# Altium footprint library JL_PCB.PCBLIB: 1129 footprints (part 20 of 72)
Each footprint in its own frame and in the unit in brackets; x right, y up, seen from the top. Pads: shape width x height; smd on the part's side, far side on the other; paste and mask are expansions set on the pad; w line width, h text height; cw(c..) or ccw(c..) is an arc to the next point about the centre after c.
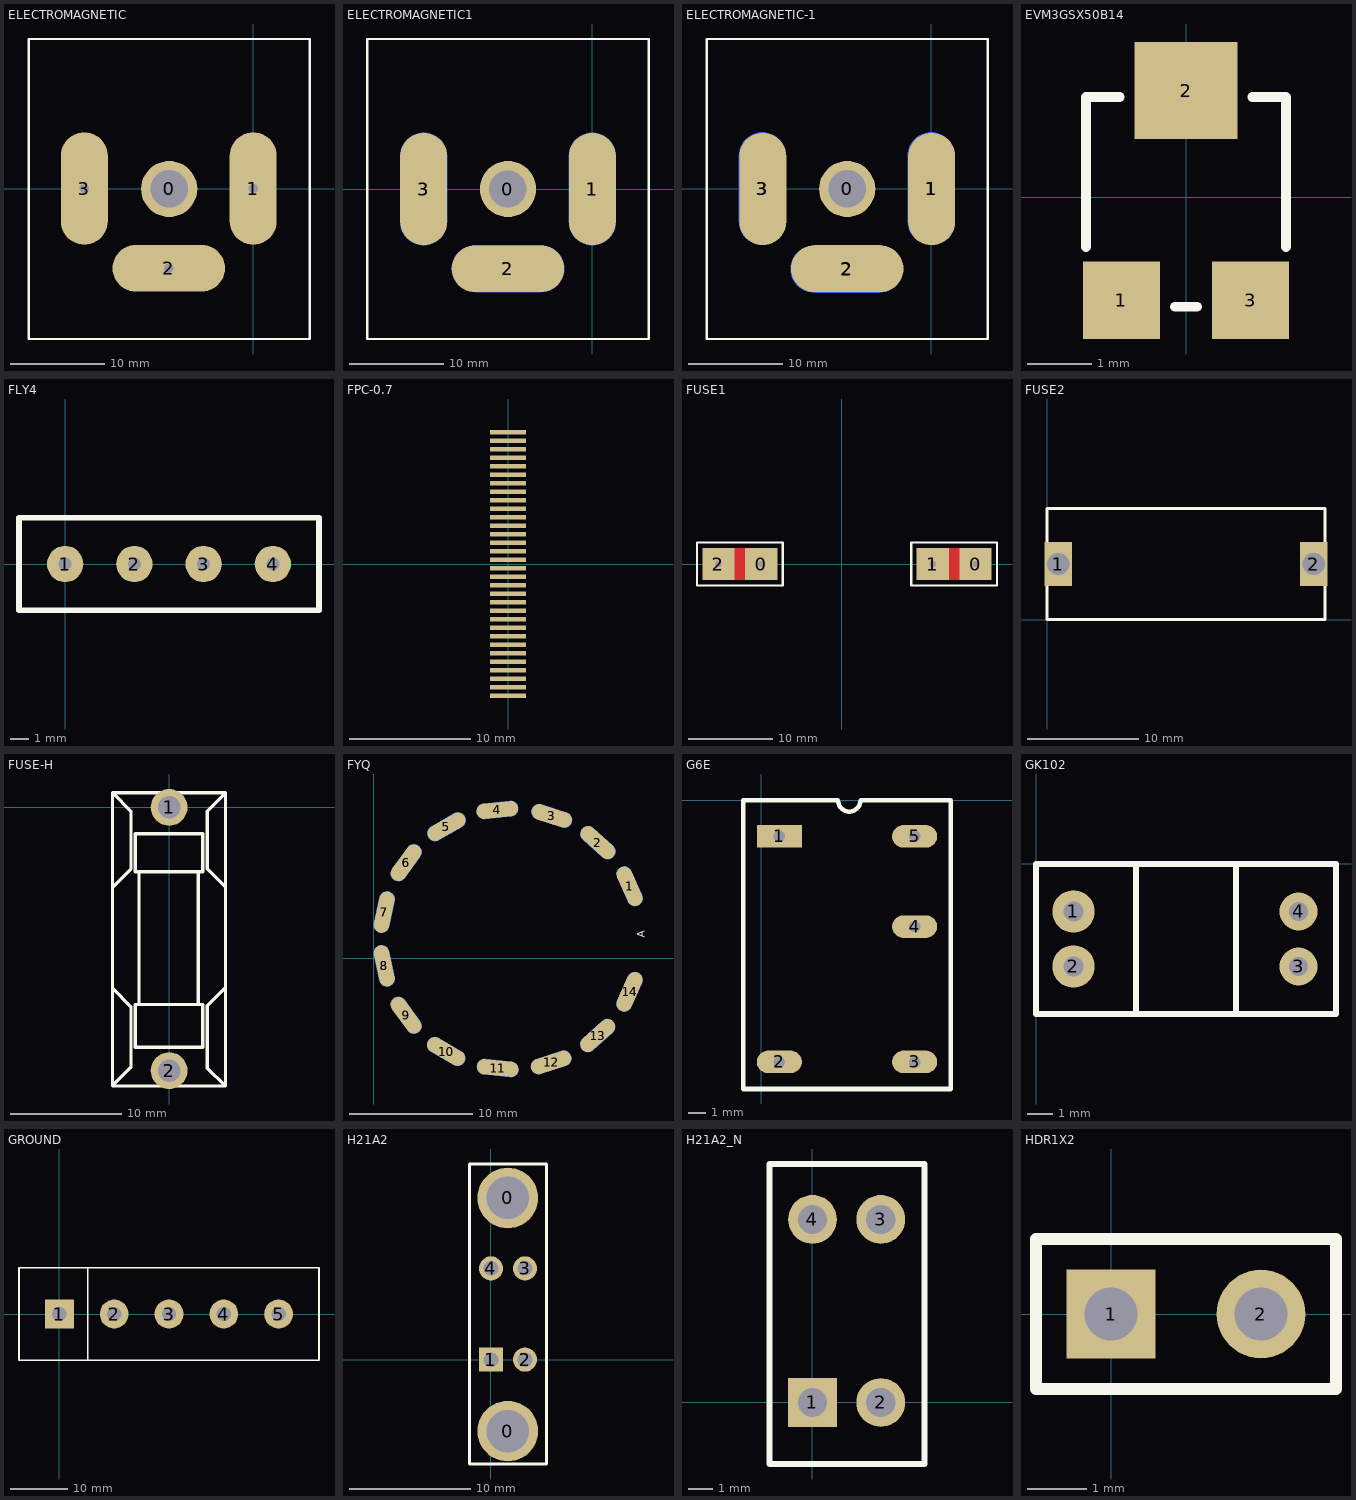
[diagram p19: the footprints below, top view; thin cyan lines are the x and y axes]

## ELECTROMAGNETIC [mm]
pads (4):
  round 6 hole 4: 0(-8.95,-0.05)
  oval 5x12 hole 1: 1(0,0) 3(-18,0)
  oval 12x5 hole 1: 2(-9,-8.5)
TopOverlay:
  lines w0.254: -23.95,-16.05 6.05,-16.05 6.05,15.95 -23.95,15.95 -23.95,-16.05
Mechanical1:
  lines w0.254: -18.45,3.9 -17.45,3.9 ; -12.7,-9.04 -12.7,-8.04 ; -0.5,3.5 0.5,3.5 ; -17.2,3.9 -16.7,3.4 ; -17.2,3.9 -16.7,3.4 ; -17.2,3.9 -16.7,3.4 ; -17.2,3.9 -18.7,3.9 -19.2,3.4 -19.2,-3.1 -19.2,-3.35 -18.7,-3.85 -17.2,-3.85 -16.7,-3.35 -16.7,3.4 ; -12.7,-7.79 -12.2,-7.29 ; -12.7,-7.79 -12.2,-7.29 ; -12.7,-7.79 -12.2,-7.29 ; -12.7,-7.79 -12.7,-9.29 -12.2,-9.79 -5.7,-9.79 -5.45,-9.79 -4.95,-9.29 -4.95,-7.79 -5.45,-7.29 -12.2,-7.29 ; 0.75,3.5 1.25,3 ; 0.75,3.5 1.25,3 ; 0.75,3.5 1.25,3 ; 0.75,3.5 -0.75,3.5 -1.25,3 -1.25,-3.5 -1.25,-3.75 -0.75,-4.25 0.75,-4.25 1.25,-3.75 1.25,3

## ELECTROMAGNETIC1 [mm]
pads (7):
  round 6 hole 4: 0(-9,0)
  oval 5x12 smd: 1(0,0) 3(-18,0)
  oval 5x12 smd far side: 1(0,0) 3(-18,0)
  oval 12x5 smd: 2(-9,-8.5)
  oval 12x5 smd far side: 2(-9,-8.5)
TopOverlay:
  lines w0.254: -24,-16 -24,16 6,16 6,-16 -24,-16
Mechanical1:
  lines w0.254: -18.5,4 -17.5,4 ; -13,-9 -13,-8 ; -0.5,4 0.5,4 ; -17.25,4 -18.75,4 -19.25,3.5 -19.25,-3 -19.25,-3.25 -18.75,-3.75 -17.25,-3.75 -16.75,-3.25 -16.75,3.5 ; -17.25,4 -16.75,3.5 ; -17.25,4 -16.75,3.5 ; -17.25,4 -16.75,3.5 ; -13,-7.75 -13,-9.25 -12.5,-9.75 -6,-9.75 -5.75,-9.75 -5.25,-9.25 -5.25,-7.75 -5.75,-7.25 -12.5,-7.25 ; -13,-7.75 -12.5,-7.25 ; -13,-7.75 -12.5,-7.25 ; -13,-7.75 -12.5,-7.25 ; 0.75,4 -0.75,4 -1.25,3.5 -1.25,-3 -1.25,-3.25 -0.75,-3.75 0.75,-3.75 1.25,-3.25 1.25,3.5 ; 0.75,4 1.25,3.5 ; 0.75,4 1.25,3.5 ; 0.75,4 1.25,3.5

## ELECTROMAGNETIC-1 [mm]
pads (7):
  round 6 hole 4: 0(-8.95,-0.05)
  oval 5x12 smd far side: 1(0,0) 3(-18,0)
  oval 5x12 smd: 1(0.05,-0.05) 3(-17.95,-0.05)
  oval 12x5 smd far side: 2(-9,-8.6)
  oval 12x5 smd: 2(-8.95,-8.55)
TopOverlay:
  lines w0.254: -23.95,-16.05 6.05,-16.05 6.05,15.95 -23.95,15.95 -23.95,-16.05
Mechanical1:
  lines w0.254: -18.45,3.9 -17.45,3.9 ; -12.7,-9.04 -12.7,-8.04 ; -0.5,3.5 0.5,3.5 ; -17.2,3.9 -16.7,3.4 ; -17.2,3.9 -16.7,3.4 ; -17.2,3.9 -16.7,3.4 ; -17.2,3.9 -18.7,3.9 -19.2,3.4 -19.2,-3.1 -19.2,-3.35 -18.7,-3.85 -17.2,-3.85 -16.7,-3.35 -16.7,3.4 ; -12.7,-7.79 -12.2,-7.29 ; -12.7,-7.79 -12.2,-7.29 ; -12.7,-7.79 -12.2,-7.29 ; -12.7,-7.79 -12.7,-9.29 -12.2,-9.79 -5.7,-9.79 -5.45,-9.79 -4.95,-9.29 -4.95,-7.79 -5.45,-7.29 -12.2,-7.29 ; 0.75,3.5 1.25,3 ; 0.75,3.5 1.25,3 ; 0.75,3.5 1.25,3 ; 0.75,3.5 -0.75,3.5 -1.25,3 -1.25,-3.5 -1.25,-3.75 -0.75,-4.25 0.75,-4.25 1.25,-3.75 1.25,3

## EVM3GSX50B14 [mm]
height 1.62
pads (3):
  rect 1.2x1.2 smd mask+0.05: 1(-1,-1.6) 3(1,-1.6)
  rect 1.6x1.5 smd mask+0.05: 2(0,1.65)
TopOverlay:
  lines w0.15: -1.55,-0.775 -1.55,1.55 -1.025,1.55 ; -0.175,-1.7 0.175,-1.7 ; 1.025,1.55 1.55,1.55 1.55,-0.775

## FLY4 [mm]
pads (4):
  round 2 hole 0.711: 1(0,0) 2(3.81,0) 3(7.62,0) 4(11.43,0)
TopOverlay:
  lines w0.305: -2.54,-2.54 13.97,-2.54 13.97,2.54 -2.54,2.54 -2.54,-2.54

## FPC-0.7 [mm]
pads (32):
  rect 3x0.4 smd: 1(0,10.85) 2(0,10.15) 3(0,9.45) 4(0,8.75) 5(0,8.05) 6(0,7.35) 7(0,6.65) 8(0,5.95) 9(0,5.25) 10(0,4.55) 11(0,3.85) 12(0,3.15) 13(0,2.45) 14(0,1.75) 15(0,1.05) 16(0,0.35) 17(0,-0.35) 18(0,-1.05) 19(0,-1.75) 20(0,-2.45) 21(0,-3.15) 22(0,-3.85) 23(0,-4.55) 24(0,-5.25) 25(0,-5.95) 26(0,-6.65) 27(0,-7.35) 28(0,-8.05) 29(0,-8.75) 30(0,-9.45) 31(0,-10.15) 32(0,-10.85)

## FUSE1 [mil]
pads (4):
  rect 150x150 hole 30: 0(-375,0) 0(625,0) 1(425,0) 2(-575,0)
TopLayer:
  rectangle: -525,-75 -425,75
  rectangle: 475,-75 575,75
BottomLayer:
  rectangle: -525,-75 -425,75
  rectangle: 475,-75 575,75
TopOverlay:
  lines w10: -675,-100 -275,-100 -275,100 -675,100 -675,-100 ; 325,-100 725,-100 725,100 325,100 325,-100
3D body "User Library-Fuse Slow-Blow.step": height 440.96, standoff 188.96, extent -621,-130 629,122
3D body "User Library-FUSECLIP.step": height 430.55, standoff -137.2, extent 414.69,-153 635.31,150.26
3D body "User Library-FUSECLIP.step": height 430.55, standoff -137.2, extent -586.32,-151.63 -365.69,151.63

## FUSE2 [mm]
pads (2):
  rect 2.5x4 hole 2: 1(1,5) 2(24,5)
TopOverlay:
  lines w0.254: 0,0 25,0 25,10 0,10 0,0
3D body "User Library-ZHL30.step": height 11.52, standoff -1.85, extent 0.348,0.228 24.748,9.628
3D body "User Library-20mm_fuse.step": height 10.5, standoff 5.5, extent 2.598,2.362 22.598,7.362

## FUSE-H [mm]
pads (2):
  round 3.3 hole 2: 1(0,-0.025) 2(0,-23.625)
TopOverlay:
  lines w0.3: -5.075,-16.25 -3.425,-17.9 -3.425,-23.325 -5,-24.9 ; -5.075,-7.2 -3.425,-5.55 -3.425,-0.375 -5.025,1.225 ; -2.7,-17.625 -2.7,-5.925 ; 2.625,-17.65 2.625,-5.85 ; 4.975,-24.95 3.425,-23.4 3.425,-17.825 5.05,-16.2 ; 5.025,1.25 3.425,-0.35 3.425,-5.525 5.05,-7.15 ; -5.075,-25 -5.075,1.3 5.05,1.3 5.05,-25 -5.075,-25 ; -3.05,-21.525 -3.05,-17.7 3.025,-17.7 3.025,-21.525 -3.05,-21.525 ; -3.05,-5.8 -3.05,-2.375 3.025,-2.375 3.025,-5.8 -3.05,-5.8

## FYQ [mil]
pads (42):
  oval 134x50 smd rot 114: 1(818.12,229.8)
  oval 134x50 smd far side rot 114: 1(818.12,229.8)
  oval 104x20 on Mech1 rot 114: 1(818.12,229.79)
  oval 134x50 smd rot 138: 2(716.69,369.4)
  oval 134x50 smd far side rot 138: 2(716.69,369.4)
  oval 104x20 on Mech1 rot 138: 2(716.69,369.41)
  oval 134x50 smd rot 162: 3(569,455)
  oval 134x50 smd far side rot 162: 3(569,455)
  oval 104x20 on Mech1 rot 162: 3(569,455)
  oval 134x50 smd rot 6: 4(395,474)
  oval 134x50 smd far side rot 6: 4(395,474)
  oval 104x20 on Mech1 rot 6: 4(395,474)
  oval 134x50 smd rot 30: 5(232,420)
  oval 134x50 smd far side rot 30: 5(232,420)
  oval 104x20 on Mech1 rot 30: 5(232,420)
  oval 134x50 smd rot 54: 6(103,305)
  oval 134x50 smd far side rot 54: 6(103,305)
  oval 104x20 on Mech1 rot 54: 6(103,305)
  oval 134x50 smd rot 78: 7(33,147)
  oval 134x50 smd far side rot 78: 7(33,147)
  oval 104x20 on Mech1 rot 78: 7(33,147)
  oval 134x50 smd rot 102: 8(33,-25)
  oval 134x50 smd far side rot 102: 8(33,-25)
  oval 104x20 on Mech1 rot 102: 8(33,-25)
  oval 134x50 smd rot 126: 9(103,-183)
  oval 134x50 smd far side rot 126: 9(103,-183)
  oval 104x20 on Mech1 rot 126: 9(103,-183)
  oval 134x50 smd rot 150: 10(231,-299)
  oval 134x50 smd far side rot 150: 10(231,-299)
  oval 104x20 on Mech1 rot 150: 10(231,-299)
  oval 134x50 smd rot 174: 11(396,-352)
  oval 134x50 smd far side rot 174: 11(396,-352)
  oval 104x20 on Mech1 rot 174: 11(396,-352)
  oval 134x50 smd rot 18: 12(567,-334)
  oval 134x50 smd far side rot 18: 12(567,-334)
  oval 104x20 on Mech1 rot 18: 12(567,-334)
  oval 134x50 smd rot 42: 13(716,-248)
  oval 134x50 smd far side rot 42: 13(716,-248)
  oval 104x20 on Mech1 rot 42: 13(716,-248)
  oval 134x50 smd rot 66: 14(818,-108)
  oval 134x50 smd far side rot 66: 14(818,-108)
  oval 104x20 on Mech1 rot 66: 14(818,-108)
TopOverlay:
  text "A" at 867,65 h25

## G6E [mil]
pads (5):
  rect 100x50 hole 25: 1(40,-80)
  oval 100x50 hole 25: 2(40,-580) 3(340,-580) 4(340,-280) 5(340,-80)
TopOverlay:
  lines w10: -40,-640 -40,0 160,0 170,0 ccw(c195,0) 220,0 420,0 420,-640 -40,-640

## GK102 [mm]
pads (4):
  round 1.7 hole 0.8: 1(1.5,-1.9) 2(1.5,-4.1)
  round 1.524 hole 0.762: 3(10.5,-4.1) 4(10.5,-1.9)
TopOverlay:
  lines w0.254: 4,-6 4,0 ; 8,-6 8,0 ; 0,-6 12,-6 12,0 0,0 0,-6

## GROUND [mm]
pads (5):
  rect 5x5 hole 2.5: 1(0,0)
  round 5 hole 2.5: 2(9.5,0) 3(19,0) 4(28.5,0) 5(38,0)
TopOverlay:
  lines w0.254: -7,-8 45,-8 ; -7,8 45,8
  lines w0.305: -7,-8 -7,8 ; 4.9,-8 4.9,8 ; 45,-8 45,8

## H21A2 [mm]
pads (6):
  round 5 hole 3.5: 0(1.385,-5.894) 0(1.385,13.306)
  rect 2x2 hole 1.2: 1(0,0)
  round 2 hole 1.2: 2(2.8,0) 3(2.8,7.5) 4(0,7.5)
TopOverlay:
  lines w0.254: -1.775,-8.6 4.575,-8.6 4.575,16.1 -1.775,16.1 -1.775,-8.6
3D body "User Library-h21a1.step": height 11.2, standoff -2, extent -1.854,-8.591 4.496,16.109

## H21A2_N [mm]
pads (4):
  rect 2x2 hole 1.2: 1(0,0)
  round 2 hole 1.2: 2(2.8,0) 3(2.8,7.5) 4(0,7.5)
TopOverlay:
  lines w0.254: -1.76,-2.52 4.59,-2.52 4.59,9.77 -1.76,9.77 -1.76,-2.52

## HDR1X2 [mm] "Connector; Header; 2 Position"
pads (2):
  rect 1.5x1.5 hole 0.9: 1(0,0)
  round 1.5 hole 0.9: 2(2.54,0)
TopOverlay:
  lines w0.2: -1.27,-1.27 -1.27,1.27 3.81,1.27 3.81,-1.27 -1.27,-1.27
3D body "HEADER.STEP": height 7.58, standoff -2.94, extent 1.27,-1.27 3.81,1.27
3D body "HEADER.STEP": height 7.58, standoff -2.94, extent -1.27,-1.27 1.27,1.27